# Altium footprint library Test.PcbLib: 245 footprints (part 14 of 17)
Each footprint in its own frame and in the unit in brackets; x right, y up, seen from the top. Pads: shape width x height; smd on the part's side, far side on the other; paste and mask are expansions set on the pad; w line width, h text height; cw(c..) or ccw(c..) is an arc to the next point about the centre after c.
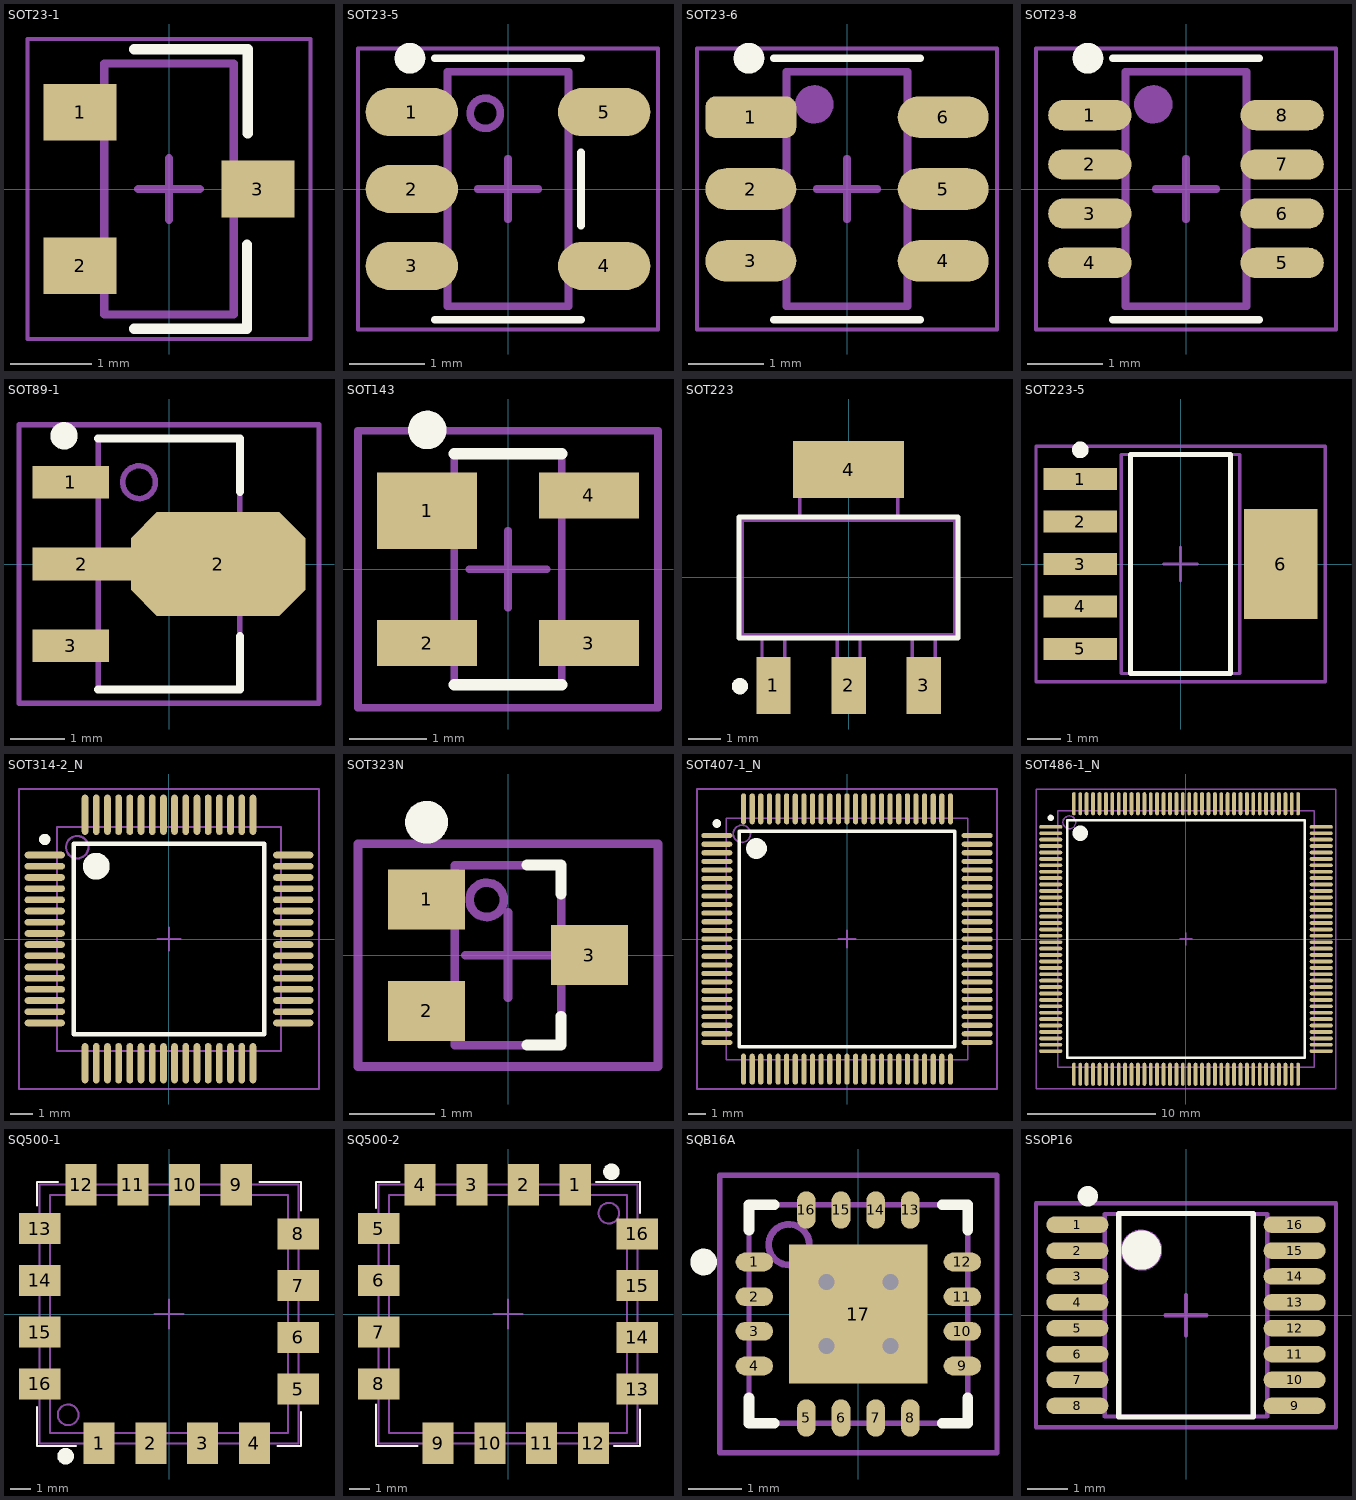
[diagram p13: the footprints below, top view; thin cyan lines are the x and y axes]

## SOT23-1 [mm]
height 1.016
pads (3):
  rect 0.9x0.7 smd: 1(-1.1,0.95) 2(-1.1,-0.95) 3(1.1,0)
Top Overlay:
  lines w0.127: -0.432,-1.727 0.965,-1.727 0.965,-0.689 ; -0.432,1.727 0.975,1.727 0.975,0.686
Mechanical 13:
  lines w0.102: -0.8,-1.55 0.8,-1.55 0.8,1.55 -0.8,1.55 -0.8,-1.55
Mechanical 15:
  lines w0.051: -1.75,-1.854 1.75,-1.854 1.75,1.854 -1.75,1.854 -1.75,-1.854
  lines w0.102: -0.381,0 0.381,0 ; 0,-0.381 0,0.381
3D body: height 1.02, standoff 0, extent -0.8,-1.55 0.8,1.55
3D body: height 0.3, standoff 0, extent -1.275,0.725 -0.8,1.175
3D body: height 0.3, standoff 0, extent -1.275,-1.175 -0.8,-0.725
3D body: height 0.3, standoff 0, extent 0.8,-0.225 1.275,0.225

## SOT23-5 [mil]
height 40
pads (5):
  oval 48x25 smd mask+2: 1(-50,40) 2(-50,0) 3(-50,-40) 4(50,-40) 5(50,40)
Top Overlay:
  circle w8: c-51,68 r4
  lines w4: -38,-68 38,-68 ; -38,68 38,68 ; 38,-19 38,19
Mechanical 13:
  circle w3.94: c-11.81,39.37 r7.87
  lines w4: -31.5,-61.02 31.5,-61.02 31.5,61.02 -31.5,61.02 -31.5,-61.02
Mechanical 15:
  lines w2: -78,-73 78,-73 78,73 -78,73 -78,-73
  lines w4: -15.75,0 15.75,0 ; 0,-15.75 0,15.75
3D body: height 11.81, standoff 0, extent 31.5,-48.23 50.2,-30.51
3D body: height 11.81, standoff 0, extent 31.5,30.51 50.2,48.23
3D body: height 11.81, standoff 0, extent -50.2,-8.86 -31.5,8.86
3D body: height 11.81, standoff 0, extent -50.2,-48.23 -31.5,-30.51
3D body: height 11.81, standoff 0, extent -50.2,30.51 -31.5,48.23
3D body: height 57.09, standoff 0, extent -31.5,-61.02 31.5,61.02
3D body: height 57.48, standoff 57.09, extent -19.84,31.34 -3.78,47.4

## SOT23-6 [mm]
height 1.016
pads (6):
  rrect50% 1.2x0.55 smd mask+0.051: 1(-1.27,0.95)
  oval 1.2x0.55 smd mask+0.051: 2(-1.27,0) 3(-1.27,-0.95) 4(1.27,-0.95) 5(1.27,0) 6(1.27,0.95)
Top Overlay:
  circle w0.203: c-1.295,1.727 r0.102
  lines w0.102: -0.965,-1.727 0.965,-1.727 ; -0.965,1.727 0.965,1.727
Mechanical 13:
  circle w0.1: c-0.432,1.118 r0.051
  circle w0.1: c-0.432,1.118 r0.127
  circle w0.1: c-0.432,1.118 r0.203
  lines w0.102: -0.8,-1.55 0.8,-1.55 0.8,1.55 -0.8,1.55 -0.8,-1.55
Mechanical 15:
  lines w0.051: -1.981,-1.854 1.981,-1.854 1.981,1.854 -1.981,1.854 -1.981,-1.854
  lines w0.102: -0.4,0 0.4,0 ; 0,-0.4 0,0.4
3D body: height 0.3, standoff 0, extent -1.275,-1.175 -0.8,-0.725
3D body: height 0.3, standoff 0, extent -1.275,-0.225 -0.8,0.225
3D body: height 0.3, standoff 0, extent -1.275,0.725 -0.8,1.175
3D body: height 0.3, standoff 0, extent 0.8,-1.175 1.275,-0.725
3D body: height 0.3, standoff 0, extent 0.8,-0.225 1.275,0.225
3D body: height 0.3, standoff 0, extent 0.8,0.725 1.275,1.175
3D body: height 1.46, standoff 1.45, extent -0.654,0.896 -0.196,1.354
3D body: height 1.45, standoff 0, extent -0.8,-1.55 0.8,1.55

## SOT23-8 [mm]
height 1.016
pads (8):
  oval 1.1x0.4 smd mask+0.051: 1(-1.27,0.975) 2(-1.27,0.325) 3(-1.27,-0.325) 4(-1.27,-0.975) 5(1.27,-0.975) 6(1.27,-0.325) 7(1.27,0.325) 8(1.27,0.975)
Top Overlay:
  circle w0.203: c-1.295,1.727 r0.102
  lines w0.102: -0.965,-1.727 0.965,-1.727 ; -0.965,1.727 0.965,1.727
Mechanical 13:
  circle w0.1: c-0.432,1.118 r0.203
  circle w0.1: c-0.432,1.118 r0.127
  circle w0.1: c-0.432,1.118 r0.051
  lines w0.102: -0.8,-1.55 -0.8,1.55 0.8,1.55 0.8,-1.55 -0.8,-1.55
Mechanical 15:
  lines w0.051: -1.981,-1.854 -1.981,1.854 1.981,1.854 1.981,-1.854 -1.981,-1.854
  lines w0.102: -0.4,0 0.4,0 ; 0,-0.4 0,0.4
3D body: height 0.2, standoff 0, extent 0.975,0.75 1.4,1.2
3D body: height 0.8, standoff 0.2, extent 0.975,0.75 1.175,1.2
3D body: height 0.9, standoff 0.7, extent 0.8,0.75 1.175,1.2
3D body: height 0.2, standoff 0, extent 0.975,0.1 1.4,0.55
3D body: height 0.8, standoff 0.2, extent 0.975,0.1 1.175,0.55
3D body: height 0.9, standoff 0.7, extent 0.8,0.1 1.175,0.55
3D body: height 0.2, standoff 0, extent 0.975,-0.55 1.4,-0.1
3D body: height 0.8, standoff 0.2, extent 0.975,-0.55 1.175,-0.1
3D body: height 0.9, standoff 0.7, extent 0.8,-0.55 1.175,-0.1
3D body: height 0.2, standoff 0, extent 0.975,-1.2 1.4,-0.75
3D body: height 0.8, standoff 0.2, extent 0.975,-1.2 1.175,-0.75
3D body: height 0.9, standoff 0.7, extent 0.8,-1.2 1.175,-0.75
3D body: height 0.2, standoff 0, extent -1.4,-1.2 -0.975,-0.75
3D body: height 0.8, standoff 0.2, extent -1.175,-1.2 -0.975,-0.75
3D body: height 0.9, standoff 0.7, extent -1.175,-1.2 -0.8,-0.75
3D body: height 0.2, standoff 0, extent -1.4,-0.55 -0.975,-0.1
3D body: height 0.8, standoff 0.2, extent -1.175,-0.55 -0.975,-0.1
3D body: height 0.9, standoff 0.7, extent -1.175,-0.55 -0.8,-0.1
3D body: height 0.2, standoff 0, extent -1.4,0.1 -0.975,0.55
3D body: height 0.8, standoff 0.2, extent -1.175,0.1 -0.975,0.55
3D body: height 0.9, standoff 0.7, extent -1.175,0.1 -0.8,0.55
3D body: height 0.9, standoff 0.7, extent -1.175,0.75 -0.8,1.2
3D body: height 0.8, standoff 0.2, extent -1.175,0.75 -0.975,1.2
3D body: height 1.45, standoff 0.15, extent -0.8,-1.55 0.8,1.55
3D body: height 1.46, standoff 1.45, extent -0.654,0.896 -0.196,1.354
3D body: height 0.2, standoff 0, extent -1.4,0.75 -0.975,1.2

## SOT89-1 [mm] "SOT89 3-Leads 4,5x2,4mm R1,50mm"
height 1.6
pads (4):
  rect 1.4x0.6 smd: 1(-1.8,1.5) 3(-1.8,-1.5)
  rect 1.8x0.6 smd: 2(-1.6,0)
  oct 3.2x1.9 smd: 2(0.9,0)
Top Overlay:
  circle w0.25: c-1.925,2.35 r0.125
  lines w0.15: -1.3,-2.3 1.3,-2.3 1.3,-1.325 ; -1.3,2.3 1.3,2.3 1.3,1.325
Mechanical 13:
  circle w0.1: c-0.55,1.5 r0.3
  lines w0.1: -1.3,-2.3 -1.3,2.3 1.3,2.3 1.3,-2.3 -1.3,-2.3
  lines w0.102: -1.3,-1.7 -2.175,-1.7 -2.175,-1.3 -1.3,-1.3 ; -1.3,-0.2 -2.175,-0.2 -2.175,0.2 -1.3,0.2 ; -1.3,1.3 -2.175,1.3 -2.175,1.7 -1.3,1.7 ; 1.3,-0.825 1.95,-0.825 2.375,-0.4 2.375,0.4 1.95,0.825 1.3,0.825
Mechanical 15:
  lines w0.1: -0.5,0 0.5,0 ; 0,-0.5 0,0.5 ; -2.75,-2.55 -2.75,2.55 2.75,2.55 2.75,-2.55 -2.75,-2.55
3D body: height 1.61, standoff 1.6, extent -0.856,1.194 -0.244,1.806
3D body: height 1.6, standoff 0, extent -1.3,-2.3 1.3,2.3
3D body: height 0.3, standoff 0, extent -2.175,-1.7 -1.3,-1.3
3D body: height 0.3, standoff 0, extent -2.175,-0.2 -1.3,0.2
3D body: height 0.3, standoff 0, extent -2.175,1.3 -1.3,1.7
3D body: height 0.3, standoff 0, extent 1.3,-0.825 2.375,0.825

## SOT143 [mm] "SOT143, 4-Leads, Body 3,0x1.3mm, Pitch 1,92mm, IPC Medium Density"
height 1.2
pads (4):
  rect 1.3x1 smd: 1(-1.05,0.76)
  rect 1.3x0.6 smd: 2(-1.05,-0.96) 3(1.05,-0.96) 4(1.05,0.96)
Top Overlay:
  circle w0.25: c-1.05,1.81 r0.125
  lines w0.15: -0.7,-1.5 0.7,-1.5 ; -0.7,1.5 0.7,1.5
Mechanical 13:
  lines w0.1: -0.7,-1.52 -0.7,1.52 0.7,1.52 0.7,-1.52 -0.7,-1.52
  lines w0.102: -0.75,-0.8 -1.3,-0.8 -1.3,-1.125 -0.7,-1.125 ; -0.7,0.4 -1.3,0.4 -1.3,1.125 -0.7,1.125 ; 0.7,-1.125 1.3,-1.125 1.3,-0.8 0.75,-0.8 ; 0.7,0.8 1.3,0.8 1.3,1.125 0.7,1.125
Mechanical 15:
  lines w0.1: -0.5,0 0.5,0 ; 0,-0.5 0,0.5 ; -1.95,-1.8 -1.95,1.8 1.95,1.8 1.95,-1.8 -1.95,-1.8
3D body: height 0.75, standoff 0.2, extent 0.7,0.8 0.95,1.125
3D body: height 0.75, standoff 0.2, extent 0.7,-1.125 0.95,-0.8
3D body: height 0.75, standoff 0.2, extent -0.95,-1.125 -0.7,-0.8
3D body: height 0.75, standoff 0.2, extent -0.95,0.4 -0.7,1.125
3D body: height 1.2, standoff 0.15, extent -0.7,-1.52 0.7,1.52
3D body: height 0.2, standoff 0, extent -1.3,0.4 -0.7,1.125
3D body: height 0.2, standoff 0, extent -1.3,-1.125 -0.7,-0.8
3D body: height 0.2, standoff 0, extent 0.7,-1.125 1.3,-0.8
3D body: height 0.2, standoff 0, extent 0.7,0.8 1.3,1.125

## SOT223 [mm]
pads (4):
  rect 1.05x1.75 smd: 1(-2.3,-3.3) 2(0,-3.3) 3(2.3,-3.3)
  rect 3.4x1.75 smd: 4(0,3.3)
Top Overlay:
  circle w0.25: c-3.325,-3.325 r0.125
  lines w0.152: -3.35,-1.85 -3.35,1.85 3.35,1.85 3.35,-1.85 -3.35,-1.85
Mechanical 13:
  lines w0.102: -2.65,-1.75 -2.65,-3.5 -1.95,-3.5 -1.95,-1.75 ; -1.5,1.75 -1.5,3.5 1.5,3.5 1.5,1.75 ; -0.35,-1.75 -0.35,-3.5 0.35,-3.5 0.35,-1.75 ; 1.95,-1.75 1.95,-3.5 2.65,-3.5 2.65,-1.75 ; -3.25,-1.75 3.25,-1.75 3.25,1.75 -3.25,1.75 -3.25,-1.75
3D body: height 1, standoff 0.8, extent -1.5,1.75 1.5,2.75
3D body: height 1, standoff 0, extent -1.5,2.55 1.5,2.75
3D body: height 0.2, standoff 0, extent -1.5,2.75 1.5,3.5
3D body: height 1, standoff 0.8, extent 1.95,-2.75 2.65,-1.75
3D body: height 1, standoff 0, extent 1.95,-2.75 2.65,-2.55
3D body: height 0.2, standoff 0, extent 1.95,-3.5 2.65,-2.75
3D body: height 1, standoff 0.8, extent -0.35,-2.75 0.35,-1.75
3D body: height 1, standoff 0, extent -0.35,-2.75 0.35,-2.55
3D body: height 0.2, standoff 0, extent -0.35,-3.5 0.35,-2.75
3D body: height 0.2, standoff 0, extent -2.65,-3.5 -1.95,-2.75
3D body: height 1, standoff 0, extent -2.65,-2.75 -1.95,-2.55
3D body: height 1, standoff 0.8, extent -2.65,-2.75 -1.95,-1.75
3D body: height 1.8, standoff 0, extent -3.25,-1.75 3.25,1.75

## SOT223-5 [mm] "SOT223, 5+1 Leads, Body 6,6x7,3mm (max), Pitch 1,27mm, IPC Medium Density"
height 1.8
pads (6):
  rect 2.2x0.65 smd: 1(-3,2.54) 2(-3,1.27) 3(-3,0) 4(-3,-1.27) 5(-3,-2.54)
  rect 2.2x3.3 smd: 6(3,0)
Top Overlay:
  circle w0.25: c-3,3.415 r0.125
  lines w0.15: -1.5,-3.275 1.5,-3.275 1.5,3.275 -1.5,3.275 -1.5,-3.275
Mechanical 13:
  lines w0.1: -1.775,-3.275 1.775,-3.275 1.775,3.275 -1.775,3.275 -1.775,-3.275
Mechanical 15:
  lines w0.1: -0.5,0 0.5,0 ; 0,-0.5 0,0.5 ; -4.325,-3.525 4.325,-3.525 4.325,3.525 -4.325,3.525 -4.325,-3.525
3D body: height 1.8, standoff 0.02, extent -1.775,-3.275 1.775,3.275

## SOT314-2_N [mm] "Thin QFP, 64-Leads, Body 10x10mm, Pitch 0.5mm, IPC Medium Density"
height 1.6
pads (64):
  oval 1.8x0.3 smd mask+0.051: 1(-5.55,3.75) 2(-5.55,3.25) 3(-5.55,2.75) 4(-5.55,2.25) 5(-5.55,1.75) 6(-5.55,1.25) 7(-5.55,0.75) 8(-5.55,0.25) 9(-5.55,-0.25) 10(-5.55,-0.75) 11(-5.55,-1.25) 12(-5.55,-1.75) 13(-5.55,-2.25) 14(-5.55,-2.75) 15(-5.55,-3.25) 16(-5.55,-3.75) 33(5.55,-3.75) 34(5.55,-3.25) 35(5.55,-2.75) 36(5.55,-2.25) 37(5.55,-1.75) 38(5.55,-1.25) 39(5.55,-0.75) 40(5.55,-0.25) 41(5.55,0.25) 42(5.55,0.75) 43(5.55,1.25) 44(5.55,1.75) 45(5.55,2.25) 46(5.55,2.75) 47(5.55,3.25) 48(5.55,3.75)
  oval 0.3x1.8 smd mask+0.051: 17(-3.75,-5.55) 18(-3.25,-5.55) 19(-2.75,-5.55) 20(-2.25,-5.55) 21(-1.75,-5.55) 22(-1.25,-5.55) 23(-0.75,-5.55) 24(-0.25,-5.55) 25(0.25,-5.55) 26(0.75,-5.55) 27(1.25,-5.55) 28(1.75,-5.55) 29(2.25,-5.55) 30(2.75,-5.55) 31(3.25,-5.55) 32(3.75,-5.55) 49(3.75,5.55) 50(3.25,5.55) 51(2.75,5.55) 52(2.25,5.55) 53(1.75,5.55) 54(1.25,5.55) 55(0.75,5.55) 56(0.25,5.55) 57(-0.25,5.55) 58(-0.75,5.55) 59(-1.25,5.55) 60(-1.75,5.55) 61(-2.25,5.55) 62(-2.75,5.55) 63(-3.25,5.55) 64(-3.75,5.55)
Top Overlay:
  circle w0.6: c-3.25,3.25 r0.3
  circle w0.25: c-5.55,4.45 r0.125
  lines w0.2: -4.25,-4.25 4.25,-4.25 4.25,4.25 -4.25,4.25 -4.25,-4.25
Mechanical 13:
  circle w0.1: c-4.1,4.1 r0.5
  lines w0.1: -5,-5 5,-5 5,5 -5,5 -5,-5
Mechanical 15:
  lines w0.1: -0.5,0 0.5,0 ; 0,-0.5 0,0.5 ; -6.7,-6.7 6.7,-6.7 6.7,6.7 -6.7,6.7 -6.7,-6.7
3D body: height 1.61, standoff 1.6, extent -4.61,3.59 -3.59,4.61
3D body: height 1.6, standoff 0, extent -5,-5 5,5

## SOT323N [mm] "SOT323 medium density (SC70)"
height 0.9
pads (3):
  rect 0.9x0.7 smd: 1(-0.95,0.65) 2(-0.95,-0.65) 3(0.95,0)
Top Overlay:
  circle w0.25: c-0.95,1.55 r0.125
  lines w0.127: 0.22,-1.05 0.62,-1.05 0.62,-0.713 ; 0.22,1.05 0.62,1.05 0.62,0.714
Mechanical 13:
  circle w0.1: c-0.249,0.644 r0.2
  lines w0.1: -0.62,-1.05 0.62,-1.05 0.62,1.05 -0.62,1.05 -0.62,-1.05
Mechanical 15:
  lines w0.1: -0.5,0 0.5,0 ; 0,-0.5 0,0.5 ; -1.75,-1.3 1.75,-1.3 1.75,1.3 -1.75,1.3 -1.75,-1.3
3D body: height 0.3, standoff 0, extent -1.095,-0.86 -0.62,-0.41
3D body: height 0.3, standoff 0, extent -1.095,0.41 -0.62,0.86
3D body: height 0.3, standoff 0, extent 0.62,-0.225 1.095,0.225
3D body: height 0.9, standoff 0.1, extent -0.62,-1.05 0.62,1.05
3D body: height 0.91, standoff 0.9, extent -0.453,0.44 -0.045,0.848

## SOT407-1_N [mm] "Thin QFP, 100-Leads, Body 14x14mm, Pitch 0.5mm, IPC Medium Density"
height 1.6
pads (100):
  oval 1.8x0.3 smd mask+0.051: 1(-7.55,6) 2(-7.55,5.5) 3(-7.55,5) 4(-7.55,4.5) 5(-7.55,4) 6(-7.55,3.5) 7(-7.55,3) 8(-7.55,2.5) 9(-7.55,2) 10(-7.55,1.5) 11(-7.55,1) 12(-7.55,0.5) 13(-7.55,0) 14(-7.55,-0.5) 15(-7.55,-1) 16(-7.55,-1.5) 17(-7.55,-2) 18(-7.55,-2.5) 19(-7.55,-3) 20(-7.55,-3.5) 21(-7.55,-4) 22(-7.55,-4.5) 23(-7.55,-5) 24(-7.55,-5.5) 25(-7.55,-6) 51(7.55,-6) 52(7.55,-5.5) 53(7.55,-5) 54(7.55,-4.5) 55(7.55,-4) 56(7.55,-3.5) 57(7.55,-3) 58(7.55,-2.5) 59(7.55,-2) 60(7.55,-1.5) 61(7.55,-1) 62(7.55,-0.5) 63(7.55,0) 64(7.55,0.5) 65(7.55,1) 66(7.55,1.5) 67(7.55,2) 68(7.55,2.5) 69(7.55,3) 70(7.55,3.5) 71(7.55,4) 72(7.55,4.5) 73(7.55,5) 74(7.55,5.5) 75(7.55,6)
  oval 0.3x1.8 smd mask+0.051: 26(-6,-7.55) 27(-5.5,-7.55) 28(-5,-7.55) 29(-4.5,-7.55) 30(-4,-7.55) 31(-3.5,-7.55) 32(-3,-7.55) 33(-2.5,-7.55) 34(-2,-7.55) 35(-1.5,-7.55) 36(-1,-7.55) 37(-0.5,-7.55) 38(0,-7.55) 39(0.5,-7.55) 40(1,-7.55) 41(1.5,-7.55) 42(2,-7.55) 43(2.5,-7.55) 44(3,-7.55) 45(3.5,-7.55) 46(4,-7.55) 47(4.5,-7.55) 48(5,-7.55) 49(5.5,-7.55) 50(6,-7.55) 76(6,7.55) 77(5.5,7.55) 78(5,7.55) 79(4.5,7.55) 80(4,7.55) 81(3.5,7.55) 82(3,7.55) 83(2.5,7.55) 84(2,7.55) 85(1.5,7.55) 86(1,7.55) 87(0.5,7.55) 88(0,7.55) 89(-0.5,7.55) 90(-1,7.55) 91(-1.5,7.55) 92(-2,7.55) 93(-2.5,7.55) 94(-3,7.55) 95(-3.5,7.55) 96(-4,7.55) 97(-4.5,7.55) 98(-5,7.55) 99(-5.5,7.55) 100(-6,7.55)
Top Overlay:
  circle w0.6: c-5.25,5.25 r0.3
  circle w0.25: c-7.55,6.7 r0.125
  lines w0.2: -6.25,-6.25 6.25,-6.25 6.25,6.25 -6.25,6.25 -6.25,-6.25
Mechanical 13:
  circle w0.1: c-6.1,6.1 r0.5
  lines w0.1: -7,-7 7,-7 7,7 -7,7 -7,-7
Mechanical 15:
  lines w0.1: -0.5,0 0.5,0 ; 0,-0.5 0,0.5 ; -8.7,-8.7 8.7,-8.7 8.7,8.7 -8.7,8.7 -8.7,-8.7
3D body: height 1.61, standoff 1.6, extent -6.61,5.59 -5.59,6.61
3D body: height 1.6, standoff 0, extent -7,-7 7,7

## SOT486-1_N [mm] "Thin QFP, 144-Leads, Body 20x20mm, Pitch 0.5mm, IPC Medium Density"
height 1.6
pads (144):
  oval 1.8x0.3 smd mask+0.051: 1(-10.55,8.75) 2(-10.55,8.25) 3(-10.55,7.75) 4(-10.55,7.25) 5(-10.55,6.75) 6(-10.55,6.25) 7(-10.55,5.75) 8(-10.55,5.25) 9(-10.55,4.75) 10(-10.55,4.25) 11(-10.55,3.75) 12(-10.55,3.25) 13(-10.55,2.75) 14(-10.55,2.25) 15(-10.55,1.75) 16(-10.55,1.25) 17(-10.55,0.75) 18(-10.55,0.25) 19(-10.55,-0.25) 20(-10.55,-0.75) 21(-10.55,-1.25) 22(-10.55,-1.75) 23(-10.55,-2.25) 24(-10.55,-2.75) 25(-10.55,-3.25) 26(-10.55,-3.75) 27(-10.55,-4.25) 28(-10.55,-4.75) 29(-10.55,-5.25) 30(-10.55,-5.75) 31(-10.55,-6.25) 32(-10.55,-6.75) 33(-10.55,-7.25) 34(-10.55,-7.75) 35(-10.55,-8.25) 36(-10.55,-8.75) 73(10.55,-8.75) 74(10.55,-8.25) 75(10.55,-7.75) 76(10.55,-7.25) 77(10.55,-6.75) 78(10.55,-6.25) 79(10.55,-5.75) 80(10.55,-5.25) 81(10.55,-4.75) 82(10.55,-4.25) 83(10.55,-3.75) 84(10.55,-3.25) 85(10.55,-2.75) 86(10.55,-2.25) 87(10.55,-1.75) 88(10.55,-1.25) 89(10.55,-0.75) 90(10.55,-0.25) 91(10.55,0.25) 92(10.55,0.75) 93(10.55,1.25) 94(10.55,1.75) 95(10.55,2.25) 96(10.55,2.75) 97(10.55,3.25) 98(10.55,3.75) 99(10.55,4.25) 100(10.55,4.75) 101(10.55,5.25) 102(10.55,5.75) 103(10.55,6.25) 104(10.55,6.75) 105(10.55,7.25) 106(10.55,7.75) 107(10.55,8.25) 108(10.55,8.75)
  oval 0.3x1.8 smd mask+0.051: 37(-8.75,-10.55) 38(-8.25,-10.55) 39(-7.75,-10.55) 40(-7.25,-10.55) 41(-6.75,-10.55) 42(-6.25,-10.55) 43(-5.75,-10.55) 44(-5.25,-10.55) 45(-4.75,-10.55) 46(-4.25,-10.55) 47(-3.75,-10.55) 48(-3.25,-10.55) 49(-2.75,-10.55) 50(-2.25,-10.55) 51(-1.75,-10.55) 52(-1.25,-10.55) 53(-0.75,-10.55) 54(-0.25,-10.55) 55(0.25,-10.55) 56(0.75,-10.55) 57(1.25,-10.55) 58(1.75,-10.55) 59(2.25,-10.55) 60(2.75,-10.55) 61(3.25,-10.55) 62(3.75,-10.55) 63(4.25,-10.55) 64(4.75,-10.55) 65(5.25,-10.55) 66(5.75,-10.55) 67(6.25,-10.55) 68(6.75,-10.55) 69(7.25,-10.55) 70(7.75,-10.55) 71(8.25,-10.55) 72(8.75,-10.55) 109(8.75,10.55) 110(8.25,10.55) 111(7.75,10.55) 112(7.25,10.55) 113(6.75,10.55) 114(6.25,10.55) 115(5.75,10.55) 116(5.25,10.55) 117(4.75,10.55) 118(4.25,10.55) 119(3.75,10.55) 120(3.25,10.55) 121(2.75,10.55) 122(2.25,10.55) 123(1.75,10.55) 124(1.25,10.55) 125(0.75,10.55) 126(0.25,10.55) 127(-0.25,10.55) 128(-0.75,10.55) 129(-1.25,10.55) 130(-1.75,10.55) 131(-2.25,10.55) 132(-2.75,10.55) 133(-3.25,10.55) 134(-3.75,10.55) 135(-4.25,10.55) 136(-4.75,10.55) 137(-5.25,10.55) 138(-5.75,10.55) 139(-6.25,10.55) 140(-6.75,10.55) 141(-7.25,10.55) 142(-7.75,10.55) 143(-8.25,10.55) 144(-8.75,10.55)
Top Overlay:
  circle w0.25: c-10.55,9.45 r0.125
  circle w0.6: c-8.25,8.25 r0.3
  lines w0.2: -9.25,-9.25 -9.25,9.25 9.25,9.25 9.25,-9.25 -9.25,-9.25
Mechanical 13:
  circle w0.1: c-9.1,9.1 r0.5
  lines w0.1: -10,-10 -10,10 10,10 10,-10 -10,-10
Mechanical 15:
  lines w0.1: -0.5,0 0.5,0 ; 0,-0.5 0,0.5 ; -11.7,-11.7 -11.7,11.7 11.7,11.7 11.7,-11.7 -11.7,-11.7
3D body: height 1.61, standoff 1.6, extent -9.61,8.59 -8.59,9.61
3D body: height 1.6, standoff 0, extent -10,-10 10,10

## SQ500-1 [mil] "VCO hybrid 0.5\" square 16 pin"
height 140
pads (16):
  rect 60x80 smd: 1(-135,-250) 2(-35,-250) 3(65,-250) 4(165,-250) 9(130,250) 10(30,250) 11(-70,250) 12(-170,250)
  rect 80x60 smd: 5(250,-145) 6(250,-45) 7(250,55) 8(250,155) 13(-250,165) 14(-250,65) 15(-250,-35) 16(-250,-135)
Top Overlay:
  circle w16: c-200,-275 r8
  lines w4.02: -255,-180 -255,-255 -180,-255 ; -255,210 -255,255 -215,255 ; 175,255 255,255 255,200 ; 210,-255 255,-255 255,-190
Mechanical 13:
  circle w3.94: c-195,-195 r20
  lines w3.94: -250,-155 ccw(c-250,-135) -250,-115 ; -250,-55 ccw(c-250,-35) -250,-15 ; -250,45 ccw(c-250,65) -250,85 ; -250,145 ccw(c-250,165) -250,185 ; -190,250 ccw(c-170,250) -150,250 ; -155,-250 cw(c-135,-250) -115,-250 ; -90,250 ccw(c-70,250) -50,250 ; -55,-250 cw(c-35,-250) -15,-250 ; 10,250 ccw(c30,250) 50,250 ; 45,-250 cw(c65,-250) 85,-250 ; 110,250 ccw(c130,250) 150,250 ; 145,-250 cw(c165,-250) 185,-250 ; 250,-165 cw(c250,-145) 250,-125 ; 250,-65 cw(c250,-45) 250,-25 ; 250,35 cw(c250,55) 250,75 ; 250,135 cw(c250,155) 250,175
  lines w4.02: -250,-155 -250,-250 -155,-250 ; -250,-115 -250,-55 ; -250,-15 -250,45 ; -250,85 -250,145 ; -250,185 -250,250 -190,250 ; -150,250 -90,250 ; -115,-250 -55,-250 ; -50,250 10,250 ; -15,-250 45,-250 ; 50,250 110,250 ; 85,-250 145,-250 ; 150,250 250,250 250,175 ; 185,-250 250,-250 250,-165 ; 250,-125 250,-65 ; 250,-25 250,35 ; 250,75 250,135 ; -230,-230 230,-230 230,230 -230,230 -230,-230
Mechanical 15:
  lines w4.02: -27.56,0 27.56,0 ; 0,-27.56 0,27.56
3D body: height 142, standoff 140, extent -215.39,-215.39 -174.61,-174.61
3D body: height 140, standoff 0, extent -230,-230 230,230
3D body: height 25, standoff 0, extent -250,-250 250,250

## SQ500-2 [mil] "VCO hybrid 0.5\" square 16 pin Z-Comm."
height 140
pads (16):
  rect 60x80 smd: 1(130,250) 2(30,250) 3(-70,250) 4(-170,250) 9(-135,-250) 10(-35,-250) 11(65,-250) 12(165,-250)
  rect 80x60 smd: 5(-250,165) 6(-250,65) 7(-250,-35) 8(-250,-135) 13(250,-145) 14(250,-45) 15(250,55) 16(250,155)
Top Overlay:
  circle w16: c200,275 r8
  lines w4.02: -255,-175 -255,-255 -175,-255 ; -255,205 -255,255 -210,255 ; 170,255 255,255 255,195 ; 205,-255 255,-255 255,-185
Mechanical 13:
  circle w3.94: c195,195 r20
  lines w3.94: -250,-155 ccw(c-250,-135) -250,-115 ; -250,-55 ccw(c-250,-35) -250,-15 ; -250,45 ccw(c-250,65) -250,85 ; -250,145 ccw(c-250,165) -250,185 ; -190,250 ccw(c-170,250) -150,250 ; -155,-250 cw(c-135,-250) -115,-250 ; -90,250 ccw(c-70,250) -50,250 ; -55,-250 cw(c-35,-250) -15,-250 ; 10,250 ccw(c30,250) 50,250 ; 45,-250 cw(c65,-250) 85,-250 ; 110,250 ccw(c130,250) 150,250 ; 145,-250 cw(c165,-250) 185,-250 ; 250,-165 cw(c250,-145) 250,-125 ; 250,-65 cw(c250,-45) 250,-25 ; 250,35 cw(c250,55) 250,75 ; 250,135 cw(c250,155) 250,175
  lines w4.02: -250,-155 -250,-250 -155,-250 ; -250,-115 -250,-55 ; -250,-15 -250,45 ; -250,85 -250,145 ; -250,185 -250,250 -190,250 ; -150,250 -90,250 ; -115,-250 -55,-250 ; -50,250 10,250 ; -15,-250 45,-250 ; 50,250 110,250 ; 85,-250 145,-250 ; 150,250 250,250 250,175 ; 185,-250 250,-250 250,-165 ; 250,-125 250,-65 ; 250,-25 250,35 ; 250,75 250,135 ; -230,-230 230,-230 230,230 -230,230 -230,-230
Mechanical 15:
  lines w4.02: -27.56,0 27.56,0 ; 0,-27.56 0,27.56
3D body: height 25, standoff 0, extent -250,-250 250,250
3D body: height 140, standoff 0, extent -230,-230 230,230

## SQB16A [mm] "QFN, 16-Leads, Body 4,1x4,1mm (max), Pitch 0,65mm, IPC Medium Density"
height 0.8
pads (17):
  oval 0.7x0.35 smd mask+0.051: 1(-1.95,0.975) 2(-1.95,0.325) 3(-1.95,-0.325) 4(-1.95,-0.975) 9(1.95,-0.975) 10(1.95,-0.325) 11(1.95,0.325) 12(1.95,0.975)
  oval 0.35x0.7 smd mask+0.051: 5(-0.975,-1.95) 6(-0.325,-1.95) 7(0.325,-1.95) 8(0.975,-1.95) 13(0.975,1.95) 14(0.325,1.95) 15(-0.325,1.95) 16(-0.975,1.95)
  rect 2.6x2.6 smd paste-5 mask-5: 17(0,0)
via 0.6,-0.6 diameter 0.65 hole 0.3
via 0.6,0.6 diameter 0.65 hole 0.3
via -0.6,0.6 diameter 0.65 hole 0.3
via -0.6,-0.6 diameter 0.65 hole 0.3
Top Overlay:
  circle w0.25: c-2.9,0.975 r0.125
  lines w0.2: -2.05,-1.575 -2.05,-2.05 -1.575,-2.05 ; -2.05,1.575 -2.05,2.05 -1.575,2.05 ; 1.575,-2.05 2.05,-2.05 2.05,-1.575 ; 1.575,2.05 2.05,2.05 2.05,1.575
Top Paste:
  region: -1.275,1.275 -0.75,1.275 -0.75,0.925 -0.925,0.75 -1.275,0.75
  region: -1.275,0.45 -0.925,0.45 -0.75,0.275 -0.75,-0.275 -0.925,-0.45 -1.275,-0.45
  region: -0.45,-0.275 -0.275,-0.45 0.275,-0.45 0.45,-0.275 0.45,0.275 0.275,0.45 -0.275,0.45 -0.45,0.275
  region: -1.275,-1.275 -1.275,-0.75 -0.925,-0.75 -0.75,-0.925 -0.75,-1.275
  region: 1.275,-1.275 0.75,-1.275 0.75,-0.925 0.925,-0.75 1.275,-0.75
  region: 1.275,1.275 1.275,0.75 0.925,0.75 0.75,0.925 0.75,1.275
  region: -0.45,-1.275 -0.45,-0.925 -0.275,-0.75 0.275,-0.75 0.45,-0.925 0.45,-1.275
  region: 1.275,-0.45 0.925,-0.45 0.75,-0.275 0.75,0.275 0.925,0.45 1.275,0.45
  region: 0.45,1.275 0.45,0.925 0.275,0.75 -0.275,0.75 -0.45,0.925 -0.45,1.275
Top Solder:
  region: -1.35,1.35 -0.6,1.35 -0.6,0.931 -0.727,0.906 -0.834,0.834 -0.906,0.727 -0.931,0.6 -0.906,0.473 -0.834,0.366 -0.727,0.294 -0.6,0.269 -0.6,0.275 -0.6,-0.275 -0.6,-0.269 -0.727,-0.294 -0.834,-0.366 -0.906,-0.473 -0.931,-0.6 -0.906,-0.727 -0.834,-0.834 -0.727,-0.906 -0.6,-0.931 -0.473,-0.906 -0.366,-0.834 -0.294,-0.727 -0.269,-0.6 -0.275,-0.6 0.275,-0.6 0.269,-0.6 0.294,-0.727 0.366,-0.834 0.473,-0.906 0.6,-0.931 0.727,-0.906 0.834,-0.834 0.906,-0.727 0.931,-0.6 0.906,-0.473 0.834,-0.366 0.727,-0.294 0.6,-0.269 0.6,-0.275 0.6,0.275 0.6,0.269 0.727,0.294 0.834,0.366 0.906,0.473 0.931,0.6 0.906,0.727 0.834,0.834 0.727,0.906 0.6,0.931 0.473,0.906 0.366,0.834 0.294,0.727 0.269,0.6 0.275,0.6 0.269,0.6 0.294,0.473 0.366,0.366 0.473,0.294 0.6,0.269 0.6,0.275 0.6,-0.269 0.473,-0.294 0.366,-0.366 0.294,-0.473 0.269,-0.6 0.275,-0.6 -0.269,-0.6 -0.294,-0.473 -0.366,-0.366 -0.473,-0.294 -0.6,-0.269 -0.6,-0.275 -0.6,0.269 -0.473,0.294 -0.366,0.366 -0.294,0.473 -0.269,0.6 -0.275,0.6 -0.269,0.6 -0.294,0.727 -0.366,0.834 -0.473,0.906 -0.6,0.931 -0.6,0.925 -0.6,1.35 1.35,1.35 1.35,-1.35 -1.35,-1.35
Mechanical 13:
  circle w0.127: c-1.3,1.3 r0.381
  lines w0.1: -2.05,-2.05 -2.05,2.05 2.05,2.05 2.05,-2.05 -2.05,-2.05
Mechanical 15:
  lines w0.1: -0.5,0 0.5,0 ; 0,-0.5 0,0.5 ; -2.6,-2.6 -2.6,2.6 2.6,2.6 2.6,-2.6 -2.6,-2.6
3D body: height 0.81, standoff 0.8, extent -1.688,0.912 -0.912,1.688
3D body: height 0.8, standoff 0.01, extent -2.05,-2.05 2.05,2.05

## SSOP16 [mil] "SSOP 16-Leads, Body 5,0x4,0mm (max), Pitch 0,63mm, IPC Medium Density"
height 68.9
pads (16):
  oval 60x16 smd mask+2: 1(-105,87.5) 2(-105,62.5) 3(-105,37.5) 4(-105,12.5) 5(-105,-12.5) 6(-105,-37.5) 7(-105,-62.5) 8(-105,-87.5) 9(105,-87.5) 10(105,-62.5) 11(105,-37.5) 12(105,-12.5) 13(105,12.5) 14(105,37.5) 15(105,62.5) 16(105,87.5)
Top Overlay:
  circle w20: c-43,63 r9
  circle w9.84: c-94.92,115 r4.92
  lines w5: -65,-98.43 65,-98.43 65,98.43 -65,98.43 -65,-98.43
Mechanical 13:
  circle w3.94: c-43,63 r18
  lines w3.94: -78.54,-98.03 78.54,-98.03 78.54,98.03 -78.54,98.03 -78.54,-98.03
Mechanical 15:
  lines w3.94: -19.68,0 19.68,0 ; 0,-19.68 0,19.68 ; -145,-108.27 145,-108.27 145,108.27 -145,108.27 -145,-108.27
3D body: height 68.9, standoff 3.94, extent -78.54,-98.03 78.54,98.03
3D body: height 69.29, standoff 68.9, extent -61.35,44.65 -24.65,81.35